# Altium footprint library dcdc_ldo_ref.pcblib: 50 footprints (part 1 of 4)
Each footprint in its own frame and in the unit in brackets; x right, y up, seen from the top. Pads: shape width x height; smd on the part's side, far side on the other; paste and mask are expansions set on the pad; w line width, h text height; cw(c..) or ccw(c..) is an arc to the next point about the centre after c.
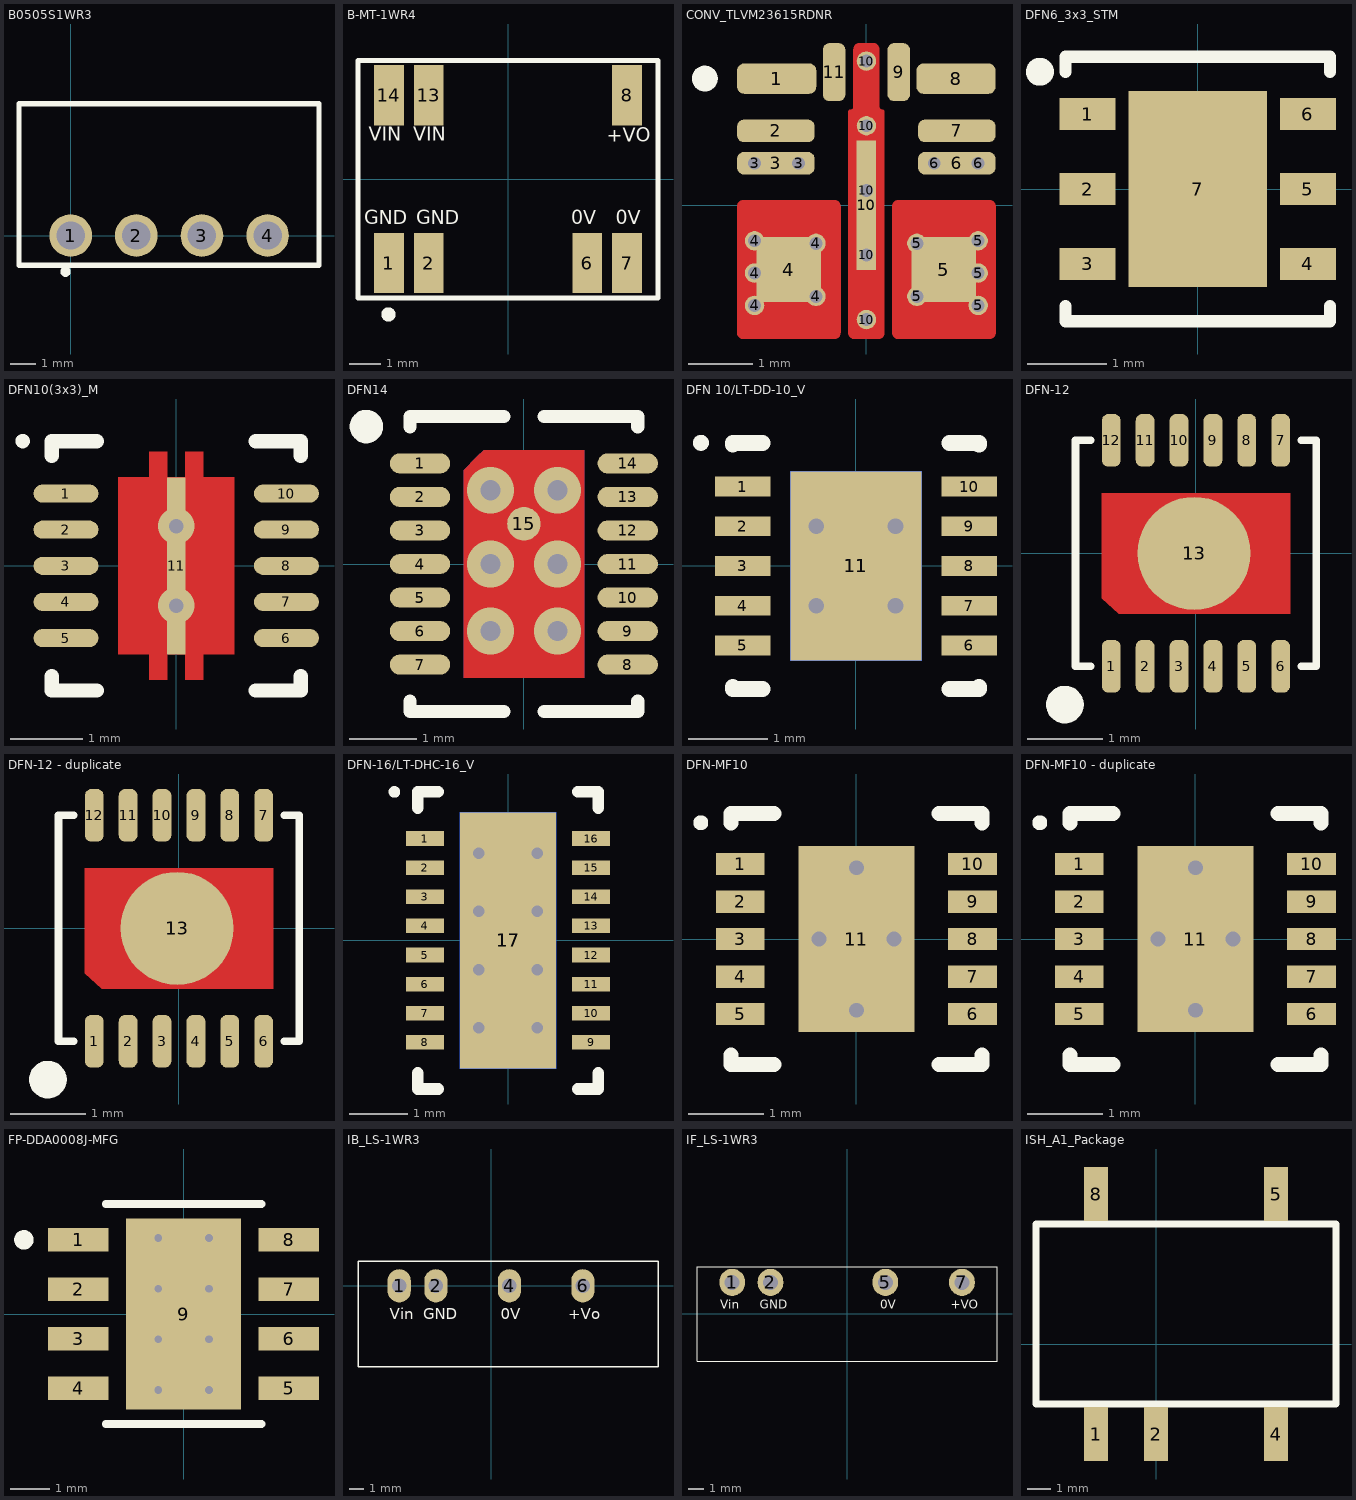
[diagram p0: the footprints below, top view; thin cyan lines are the x and y axes]

## B0505S1WR3 [mm]
pads (4):
  round 1.65 hole 1.1: 1(0,0) 2(2.54,0) 3(5.08,0) 4(7.62,0)
Top Overlay:
  lines w0.2: -2,-1.15 -2,5.1 9.61,5.1 9.61,-1.15 -2,-1.15 ; -0.3,-1.4 ccw(c-0.2,-1.4) -0.1,-1.4 ccw(c-0.2,-1.4) -0.3,-1.4
3D body "B0505S-1WR3.stp": height 10.08, standoff -4.18, extent -1.994,-0.827 9.614,5.167

## B-MT-1WR4 [mm] "dc-dc converter 1W"
pads (7):
  rect 0.95x1.925 smd paste+0 mask-0.075: 1(-3.81,-2.685) 2(-2.54,-2.685) 6(2.54,-2.685) 7(3.81,-2.685) 8(3.81,2.688) 13(-2.54,2.688) 14(-3.81,2.688)
Top Overlay:
  circle w0.254: c-3.825,-4.325 r0.1
  lines w0.152: -4.8,-3.8 4.8,-3.8 4.8,3.8 -4.8,3.8 -4.8,-3.8
  text "GND" at -4.6,-1.6 h0.76
  text "GND" at -2.938,-1.6 h0.76
  text "0V" at 2.025,-1.593 h0.76
  text "0V" at 3.446,-1.593 h0.76
  text "+VO" at 3.16,1.046 h0.76
  text "VIN" at -3.025,1.075 h0.76
  text "VIN" at -4.45,1.075 h0.76
3D body "B05xxMT-1WR4.stp": height 3.11, standoff 0, extent -4.5,-3.504 4.5,3.5

## CONV_TLVM23615RDNR [mm]
pads (30):
  rrect45% 1.225x0.47 smd paste-2 mask+0: 1(-1.388,1.96) 8(1.388,1.96)
  rrect60% 1.2x0.35 smd paste-2 mask+0: 2(-1.4,1.15) 3(-1.4,0.65) 6(1.4,0.65) 7(1.4,1.15)
  round 0.3 hole 0.2 mask+0: 3(-1.729,0.65) 3(-1.05,0.65) 4(-1.73,-1.55) 4(-1.73,-1.05) 4(-1.73,-0.55) 4(-0.78,-1.41) 4(-0.78,-0.59) 5(0.78,-1.41) 5(0.78,-0.59) 5(1.73,-1.55) 5(1.73,-1.05) 5(1.73,-0.55) 6(1.05,0.65) 6(1.729,0.65) 10(0,-1.77) 10(0,-0.77) 10(0,0.23) 10(0,1.23) 10(0,2.23)
  rect 1x1 smd paste-1 mask+0: 4(-1.2,-0.995) 5(1.2,-0.995)
  rrect60% 0.35x0.9 smd paste-1 mask+0: 9(0.5,2.06) 11(-0.5,2.06)
  rect 0.3x2 smd paste-2 mask+0: 10(0,0)
Top Layer:
  region: -0.49,0.079 -0.484,0.079 -0.479,0.078 -0.474,0.077 -0.469,0.075 -0.464,0.073 -0.459,0.071 -0.455,0.069 -0.45,0.067 -0.446,0.064 -0.441,0.061 -0.437,0.058 -0.433,0.054 -0.429,0.051 -0.426,0.047 -0.422,0.043 -0.419,0.039 -0.416,0.034 -0.413,0.03 -0.411,0.025 -0.409,0.021 -0.407,0.016 -0.405,0.011 -0.403,0.006 -0.402,0.001 -0.401,-0.004 -0.401,-0.01 -0.4,-0.015 -0.4,-0.02 -0.4,-1.97 -0.4,-1.975 -0.401,-1.98 -0.401,-1.986 -0.402,-1.991 -0.403,-1.996 -0.405,-2.001 -0.407,-2.006 -0.409,-2.011 -0.411,-2.015 -0.413,-2.02 -0.416,-2.024 -0.419,-2.029 -0.422,-2.033 -0.426,-2.037 -0.429,-2.041 -0.433,-2.044 -0.437,-2.048 -0.441,-2.051 -0.446,-2.054 -0.45,-2.057 -0.455,-2.059 -0.459,-2.061 -0.464,-2.063 -0.469,-2.065 -0.474,-2.067 -0.479,-2.068 -0.484,-2.069 -0.49,-2.069 -0.495,-2.07 -1.905,-2.07 -1.91,-2.069 -1.916,-2.069 -1.921,-2.068 -1.926,-2.067 -1.931,-2.065 -1.936,-2.063 -1.941,-2.061 -1.945,-2.059 -1.95,-2.057 -1.954,-2.054 -1.959,-2.051 -1.963,-2.048 -1.967,-2.044 -1.971,-2.041 -1.974,-2.037 -1.978,-2.033 -1.981,-2.029 -1.984,-2.024 -1.987,-2.02 -1.989,-2.015 -1.991,-2.011 -1.993,-2.006 -1.995,-2.001 -1.997,-1.996 -1.998,-1.991 -1.999,-1.986 -1.999,-1.98 -2,-1.975 -2,-1.97 -2,-0.02 -2,-0.015 -1.999,-0.01 -1.999,-0.004 -1.998,0.001 -1.997,0.006 -1.995,0.011 -1.993,0.016 -1.991,0.021 -1.989,0.025 -1.987,0.03 -1.984,0.034 -1.981,0.039 -1.978,0.043 -1.974,0.047 -1.971,0.051 -1.967,0.054 -1.963,0.058 -1.959,0.061 -1.954,0.064 -1.95,0.067 -1.945,0.069 -1.941,0.071 -1.936,0.073 -1.931,0.075 -1.926,0.077 -1.921,0.078 -1.916,0.079 -1.91,0.079 -1.905,0.08 -0.495,0.08
  region: 232 vertices and 0 holes, not listed, extent -0.28,-2.07 0.28,2.51
  region: 1.91,0.079 1.916,0.079 1.921,0.078 1.926,0.077 1.931,0.075 1.936,0.073 1.941,0.071 1.945,0.069 1.95,0.067 1.954,0.064 1.959,0.061 1.963,0.058 1.967,0.054 1.971,0.051 1.974,0.047 1.978,0.043 1.981,0.039 1.984,0.034 1.987,0.03 1.989,0.025 1.991,0.021 1.993,0.016 1.995,0.011 1.997,0.006 1.998,0.001 1.999,-0.004 1.999,-0.01 2,-0.015 2,-0.02 2,-1.97 2,-1.975 1.999,-1.98 1.999,-1.986 1.998,-1.991 1.997,-1.996 1.995,-2.001 1.993,-2.006 1.991,-2.011 1.989,-2.015 1.987,-2.02 1.984,-2.024 1.981,-2.029 1.978,-2.033 1.974,-2.037 1.971,-2.041 1.967,-2.044 1.963,-2.048 1.959,-2.051 1.954,-2.054 1.95,-2.057 1.945,-2.059 1.941,-2.061 1.936,-2.063 1.931,-2.065 1.926,-2.067 1.921,-2.068 1.916,-2.069 1.91,-2.069 1.905,-2.07 0.495,-2.07 0.49,-2.069 0.484,-2.069 0.479,-2.068 0.474,-2.067 0.469,-2.065 0.464,-2.063 0.459,-2.061 0.455,-2.059 0.45,-2.057 0.446,-2.054 0.441,-2.051 0.437,-2.048 0.433,-2.044 0.429,-2.041 0.426,-2.037 0.422,-2.033 0.419,-2.029 0.416,-2.024 0.413,-2.02 0.411,-2.015 0.409,-2.011 0.407,-2.006 0.405,-2.001 0.403,-1.996 0.402,-1.991 0.401,-1.986 0.401,-1.98 0.4,-1.975 0.4,-1.97 0.4,-0.02 0.4,-0.015 0.401,-0.01 0.401,-0.004 0.402,0.001 0.403,0.006 0.405,0.011 0.407,0.016 0.409,0.021 0.411,0.025 0.413,0.03 0.416,0.034 0.419,0.039 0.422,0.043 0.426,0.047 0.429,0.051 0.433,0.054 0.437,0.058 0.441,0.061 0.446,0.064 0.45,0.067 0.455,0.069 0.459,0.071 0.464,0.073 0.469,0.075 0.474,0.077 0.479,0.078 0.484,0.079 0.49,0.079 0.495,0.08 1.905,0.08
Top Overlay:
  circle w0.2: c-2.5,1.96 r0.1
Top Paste:
  drawing of 23 lines, arcs and shapes, not listed
Top Solder:
  drawing of 11 lines, arcs and shapes, not listed
3D body "step_temp.STEP": height 2.1, standoff 0, extent -1.75,-2.25 1.75,2.25

## DFN6_3x3_STM [mil]
pads (7):
  rect 28x16 smd paste+0 mask+0: 1(-55,37.4) 2(-55,0) 3(-55,-37.4) 4(55,-37.4) 5(55,0) 6(55,37.4)
  rect 69x98 smd paste+0 mask+0: 7(0,0)
Top Overlay:
  circle w10: c-78.74,58.5 r1.97
  lines w6: -66,-58.5 -66,-66 66,-66 66,-58.5 ; -66,58.5 -66,66 66,66 66,58.5
3D body "DFN6_3X3_STM.step": height 39.09, standoff 0, extent -60.98,-60.98 60.98,60.98

## DFN10(3x3)_M [mm] "SON, 10-Leads, Body 3x3mm, Pitch 0.5mm, Thermal Pad 2.45x1.6mm, IPC Low Density"
height 1
pads (11):
  oval 0.9x0.25 smd: 1(-1.525,1) 2(-1.525,0.5) 3(-1.525,0) 4(-1.525,-0.5) 5(-1.525,-1) 6(1.525,-1) 7(1.525,-0.5) 8(1.525,0) 9(1.525,0.5) 10(1.525,1)
  rect 0.25x2.45 smd paste+0 mask+0: 11(0,0)
via 0,0.55 diameter 0.5 hole 0.2
via 0,-0.55 diameter 0.5 hole 0.2
Top Layer:
  region: -0.8,-1.225 -0.375,-1.225 -0.375,-1.575 -0.125,-1.575 -0.125,-1.225 0.125,-1.225 0.125,-1.575 0.375,-1.575 0.375,-1.225 0.8,-1.225 0.8,1.225 0.375,1.225 0.375,1.575 0.125,1.575 0.125,1.225 -0.125,1.225 -0.125,1.575 -0.375,1.575 -0.375,1.225 -0.8,1.225
Top Overlay:
  circle w0.1: c-2.125,1.725 r0.05
  lines w0.2: -1.725,-1.525 -1.725,-1.725 -1.1,-1.725 ; -1.725,1.525 -1.725,1.725 -1.1,1.725 ; 1.1,-1.725 1.725,-1.725 1.725,-1.525 ; 1.1,1.725 1.725,1.725 1.725,1.525
3D body "User Library-My-DFN-10-3x3-0_5.STEP": height 0.8, standoff 0, extent -1.57,-1.55 1.55,1.55

## DFN14 [mm]
pads (15):
  oval 0.9x0.3 smd: 1(-1.55,1.5) 2(-1.55,1) 3(-1.55,0.5) 4(-1.55,0) 5(-1.55,-0.5) 6(-1.55,-1) 7(-1.55,-1.5) 8(1.55,-1.5) 9(1.55,-1) 10(1.55,-0.5) 11(1.55,0) 12(1.55,0.5) 13(1.55,1) 14(1.55,1.5)
  round 0.5 smd: 15(0,0.6)
via -0.5,1.1 diameter 0.7 hole 0.3
via 0.5,1.1 diameter 0.7 hole 0.3
via -0.5,0 diameter 0.7 hole 0.3
via 0.5,0 diameter 0.7 hole 0.3
via -0.5,-1 diameter 0.7 hole 0.3
via 0.5,-1 diameter 0.7 hole 0.3
Top Layer:
  region: -0.9,-1.7 -0.9,1.4 -0.7,1.6 -0.6,1.7 0.9,1.7 0.9,-1.7
Bottom Layer:
  region: -0.9,-1.7 -0.9,1.4 -0.7,1.6 -0.6,1.7 0.9,1.7 0.9,-1.7
Top Overlay:
  circle w0.25: c-2.35,2.05 r0.125
  lines w0.2: -1.7,-2.05 -1.7,-2.2 -0.3,-2.2 ; -1.7,2.05 -1.7,2.2 -0.3,2.2 ; 0.3,-2.2 1.7,-2.2 1.7,-2.05 ; 0.3,2.2 1.7,2.2 1.7,2.05
Top Solder:
  region: -0.9,-1.7 -0.9,1.4 -0.7,1.6 -0.6,1.7 0.9,1.7 0.9,-1.7
3D body "User Library-LT3479EDE#PBF-2.step": height 0.75, standoff 0, extent -1.5,-2 1.5,2

## DFN 10/LT-DD-10_V [mm] "SON, 10-Leads, Body 3x3mm, Pitch 0.5mm, Thermal Pad 2.38x1.65mm"
height 0.8
pads (12):
  rect 0.7x0.25 smd mask+0.102: 1(-1.425,1) 2(-1.425,0.5) 3(-1.425,0) 4(-1.425,-0.5) 5(-1.425,-1) 6(1.425,-1) 7(1.425,-0.5) 8(1.425,0) 9(1.425,0.5) 10(1.425,1)
  rect 1.65x2.38 smd mask+0.102: 11(0,0)
  rect 1.65x2.38 smd far side mask+0.102: 11(0,0)
via -0.5,0.5 diameter 0.5 hole 0.2
via 0.5,0.5 diameter 0.5 hole 0.2
via -0.5,-0.5 diameter 0.5 hole 0.2
via 0.5,-0.5 diameter 0.5 hole 0.2
Top Overlay:
  circle w0.1: c-1.95,1.55 r0.05
  lines w0.2: -1.55,-1.525 -1.55,-1.55 -1.175,-1.55 ; -1.55,1.525 -1.55,1.55 -1.175,1.55 ; 1.175,-1.55 1.55,-1.55 1.55,-1.525 ; 1.175,1.55 1.55,1.55 1.55,1.525
3D body "User Library-DFN10-1.STEP": height 0.8, standoff 0, extent -1.51,-1.5 1.51,1.5

## DFN-12 [mm]
pads (13):
  rrect70% 0.25x0.7 smd mask+0.05: 1(-1.125,-1.5) 2(-0.675,-1.5) 3(-0.225,-1.5) 4(0.225,-1.5) 5(0.675,-1.5) 6(1.125,-1.5) 7(1.125,1.5) 8(0.675,1.5) 9(0.225,1.5) 10(-0.225,1.5) 11(-0.675,1.5) 12(-1.125,1.5)
  round 1.5 smd paste+0 mask+0: 13(-0.025,0)
Top Layer:
  region: -1.25,0.8 1.25,0.8 1.25,-0.8 -1.025,-0.8 -1.25,-0.6
Top Overlay:
  circle w0.25: c-1.74,-2.009 r0.125
  lines w0.1: -1.4,-1.5 -1.6,-1.5 -1.6,1.5 -1.4,1.5 ; 1.4,-1.5 1.6,-1.5 1.6,1.5 1.4,1.5
Top Solder:
  region: -1.25,0.8 1.25,0.8 1.25,-0.8 -1.025,-0.8 -1.25,-0.6
3D body "User Library-DFN12(3x3).step": height 0.76, standoff 0, extent -1.5,-1.5 1.5,1.502

## DFN-12 - duplicate [mm]
pads (13):
  rrect70% 0.25x0.7 smd mask+0.05: 1(-1.125,-1.5) 2(-0.675,-1.5) 3(-0.225,-1.5) 4(0.225,-1.5) 5(0.675,-1.5) 6(1.125,-1.5) 7(1.125,1.5) 8(0.675,1.5) 9(0.225,1.5) 10(-0.225,1.5) 11(-0.675,1.5) 12(-1.125,1.5)
  round 1.5 smd paste+0 mask+0: 13(-0.025,0)
Top Layer:
  region: -1.25,0.8 1.25,0.8 1.25,-0.8 -1.025,-0.8 -1.25,-0.6
Top Overlay:
  circle w0.25: c-1.74,-2.009 r0.125
  lines w0.1: -1.4,-1.5 -1.6,-1.5 -1.6,1.5 -1.4,1.5 ; 1.4,-1.5 1.6,-1.5 1.6,1.5 1.4,1.5
Top Solder:
  region: -1.25,0.8 1.25,0.8 1.25,-0.8 -1.025,-0.8 -1.25,-0.6
3D body "User Library-DFN12(3x3).step": height 0.76, standoff 0, extent -1.5,-1.5 1.5,1.502

## DFN-16/LT-DHC-16_V [mm] "SON, 16-Leads, Body 5x3mm, Pitch 0.5mm, Thermal Pad 4.4X1.65mm"
height 0.8
pads (18):
  rect 0.65x0.25 smd: 1(-1.425,1.75) 2(-1.425,1.25) 3(-1.425,0.75) 4(-1.425,0.25) 5(-1.425,-0.25) 6(-1.425,-0.75) 7(-1.425,-1.25) 8(-1.425,-1.75) 9(1.425,-1.75) 10(1.425,-1.25) 11(1.425,-0.75) 12(1.425,-0.25) 13(1.425,0.25) 14(1.425,0.75) 15(1.425,1.25) 16(1.425,1.75)
  rect 1.65x4.4 smd: 17(0,0)
  rect 1.65x4.4 smd far side: 17(0,0)
via 0.5,-1.5 diameter 0.5 hole 0.2
via -0.5,-1.5 diameter 0.5 hole 0.2
via 0.5,-0.5 diameter 0.5 hole 0.2
via -0.5,-0.5 diameter 0.5 hole 0.2
via 0.5,0.5 diameter 0.5 hole 0.2
via -0.5,0.5 diameter 0.5 hole 0.2
via 0.5,1.5 diameter 0.5 hole 0.2
via -0.5,1.5 diameter 0.5 hole 0.2
Top Overlay:
  circle w0.1: c-1.95,2.55 r0.05
  lines w0.2: -1.55,-2.275 -1.55,-2.55 -1.2,-2.55 ; -1.55,2.275 -1.55,2.55 -1.2,2.55 ; 1.2,-2.55 1.55,-2.55 1.55,-2.275 ; 1.2,2.55 1.55,2.55 1.55,2.275
3D body "User Library-My-DFN-16-5x3-0_5.STEP": height 0.8, standoff 0, extent -1.56,-2.55 1.56,2.55

## DFN-MF10 [mm] "SON, 10-Leads, Body 3x3mm, Pitch 0.5mm, Microchip Recommended"
height 1
pads (11):
  rect 0.65x0.3 smd: 1(-1.55,1) 2(-1.55,0.5) 3(-1.55,0) 4(-1.55,-0.5) 5(-1.55,-1) 6(1.55,-1) 7(1.55,-0.5) 8(1.55,0) 9(1.55,0.5) 10(1.55,1)
  rect 1.55x2.48 smd: 11(0,0)
via 0,-0.95 diameter 0.5 hole 0.2
via 0,0.95 diameter 0.5 hole 0.2
via 0.5,0 diameter 0.5 hole 0.2
via -0.5,0 diameter 0.5 hole 0.2
Top Overlay:
  circle w0.1: c-2.075,1.55 r0.05
  lines w0.2: -1.675,-1.55 -1.675,-1.675 -1.1,-1.675 ; -1.675,1.55 -1.675,1.675 -1.1,1.675 ; 1.1,-1.675 1.675,-1.675 1.675,-1.55 ; 1.1,1.675 1.675,1.675 1.675,1.55
3D body: height 1, standoff 0, extent -1.524,-1.524 1.524,1.524

## DFN-MF10 - duplicate [mm] "SON, 10-Leads, Body 3x3mm, Pitch 0.5mm, Microchip Recommended"
height 1
pads (11):
  rect 0.65x0.3 smd: 1(-1.55,1) 2(-1.55,0.5) 3(-1.55,0) 4(-1.55,-0.5) 5(-1.55,-1) 6(1.55,-1) 7(1.55,-0.5) 8(1.55,0) 9(1.55,0.5) 10(1.55,1)
  rect 1.55x2.48 smd: 11(0,0)
via 0,-0.95 diameter 0.5 hole 0.2
via 0,0.95 diameter 0.5 hole 0.2
via 0.5,0 diameter 0.5 hole 0.2
via -0.5,0 diameter 0.5 hole 0.2
Top Overlay:
  circle w0.1: c-2.075,1.55 r0.05
  lines w0.2: -1.675,-1.55 -1.675,-1.675 -1.1,-1.675 ; -1.675,1.55 -1.675,1.675 -1.1,1.675 ; 1.1,-1.675 1.675,-1.675 1.675,-1.55 ; 1.1,1.675 1.675,1.675 1.675,1.55
3D body: height 1, standoff 0, extent -1.524,-1.524 1.524,1.524

## FP-DDA0008J-MFG [mm]
pads (9):
  rect 1.55x0.6 smd paste+0 mask+0: 1(-2.7,1.905) 2(-2.7,0.635) 3(-2.7,-0.635) 4(-2.7,-1.905) 5(2.7,-1.905) 6(2.7,-0.635) 7(2.7,0.635) 8(2.7,1.905)
  rect 2.95x4.9 smd paste-1000 mask-1000: 9(0,0)
via 0.65,-1.95 diameter 0.5 hole 0.2
via 0.65,-0.65 diameter 0.5 hole 0.2
via 0.65,0.65 diameter 0.5 hole 0.2
via 0.65,1.95 diameter 0.5 hole 0.2
via -0.65,-1.95 diameter 0.5 hole 0.2
via -0.65,-0.65 diameter 0.5 hole 0.2
via -0.65,0.65 diameter 0.5 hole 0.2
via -0.65,1.95 diameter 0.5 hole 0.2
Top Overlay:
  circle w0.25: c-4.1,1.905 r0.125
  lines w0.2: -2,-2.825 2,-2.825 ; -2,2.825 2,2.825
Top Paste:
  rectangle: -1.3,-1.55 1.3,1.55
Top Solder:
  rectangle: -1.3,-1.55 1.3,1.55
3D body "IC_Texas_Instruments_OPA454AIDDAR_eec.STEP": height 0.25, standoff 0, extent -3.575,-2.75 3.575,2.75

## IB_LS-1WR3 [mm]
pads (4):
  oval 1.6x2.3 hole 1: 1(-6.35,0) 2(-3.81,0) 4(1.27,0) 6(6.35,0)
Top Overlay:
  lines w0.102: -9.2,-5.6 -9.2,1.7 11.55,1.7 11.55,-5.6 -9.2,-5.6
  text "+Vo" at 5.337,-2.308 h0.76
  text "0V" at 0.684,-2.308 h0.76
  text "GND" at -4.699,-2.308 h0.76
  text "Vin" at -7.014,-2.308 h0.76
3D body "IB_LS-1WR3.stp": height 10.16, standoff -4.1, extent -8.577,-5.074 11.073,0.926

## IF_LS-1WR3 [mm]
pads (4):
  oval 1.7x1.8 hole 1: 1(-7.615,2.1) 2(-5.075,2.1) 5(2.545,2.1) 7(7.625,2.1)
Top Overlay:
  lines w0.076: -9.95,-3.125 -9.95,3.125 9.95,3.125 9.95,-3.125 -9.95,-3.125
  text "+VO" at 6.896,0.148 h1
  text "0V" at 2.21,0.148 h1
  text "GND" at -5.789,0.148 h1
  text "Vin" at -8.396,0.148 h1
3D body "IF_LS-1WR3.stp": height 10.16, standoff -4.1, extent -9.825,-3 9.825,3

## ISH_A1_Package [mm] "DC-DC XP power"
pads (5):
  rect 1x2.29 smd: 1(-2.54,-3.81) 2(0,-3.81) 4(5.08,-3.81) 5(5.08,6.35) 8(-2.54,6.35)
Top Overlay:
  lines w0.3: -5.08,-2.54 -5.08,5.08 7.62,5.08 7.62,-2.54 -5.08,-2.54
3D body "User Library-ISF_A1_Package.stp": height 6.5, standoff 0, extent -5.08,-4.33 7.62,6.87